# Altium footprint library connectors_ITS.PcbLib: 30 footprints (part 2 of 2)
Each footprint in its own frame and in the unit in brackets; x right, y up, seen from the top. Pads: shape width x height; smd on the part's side, far side on the other; paste and mask are expansions set on the pad; w line width, h text height; cw(c..) or ccw(c..) is an arc to the next point about the centre after c.
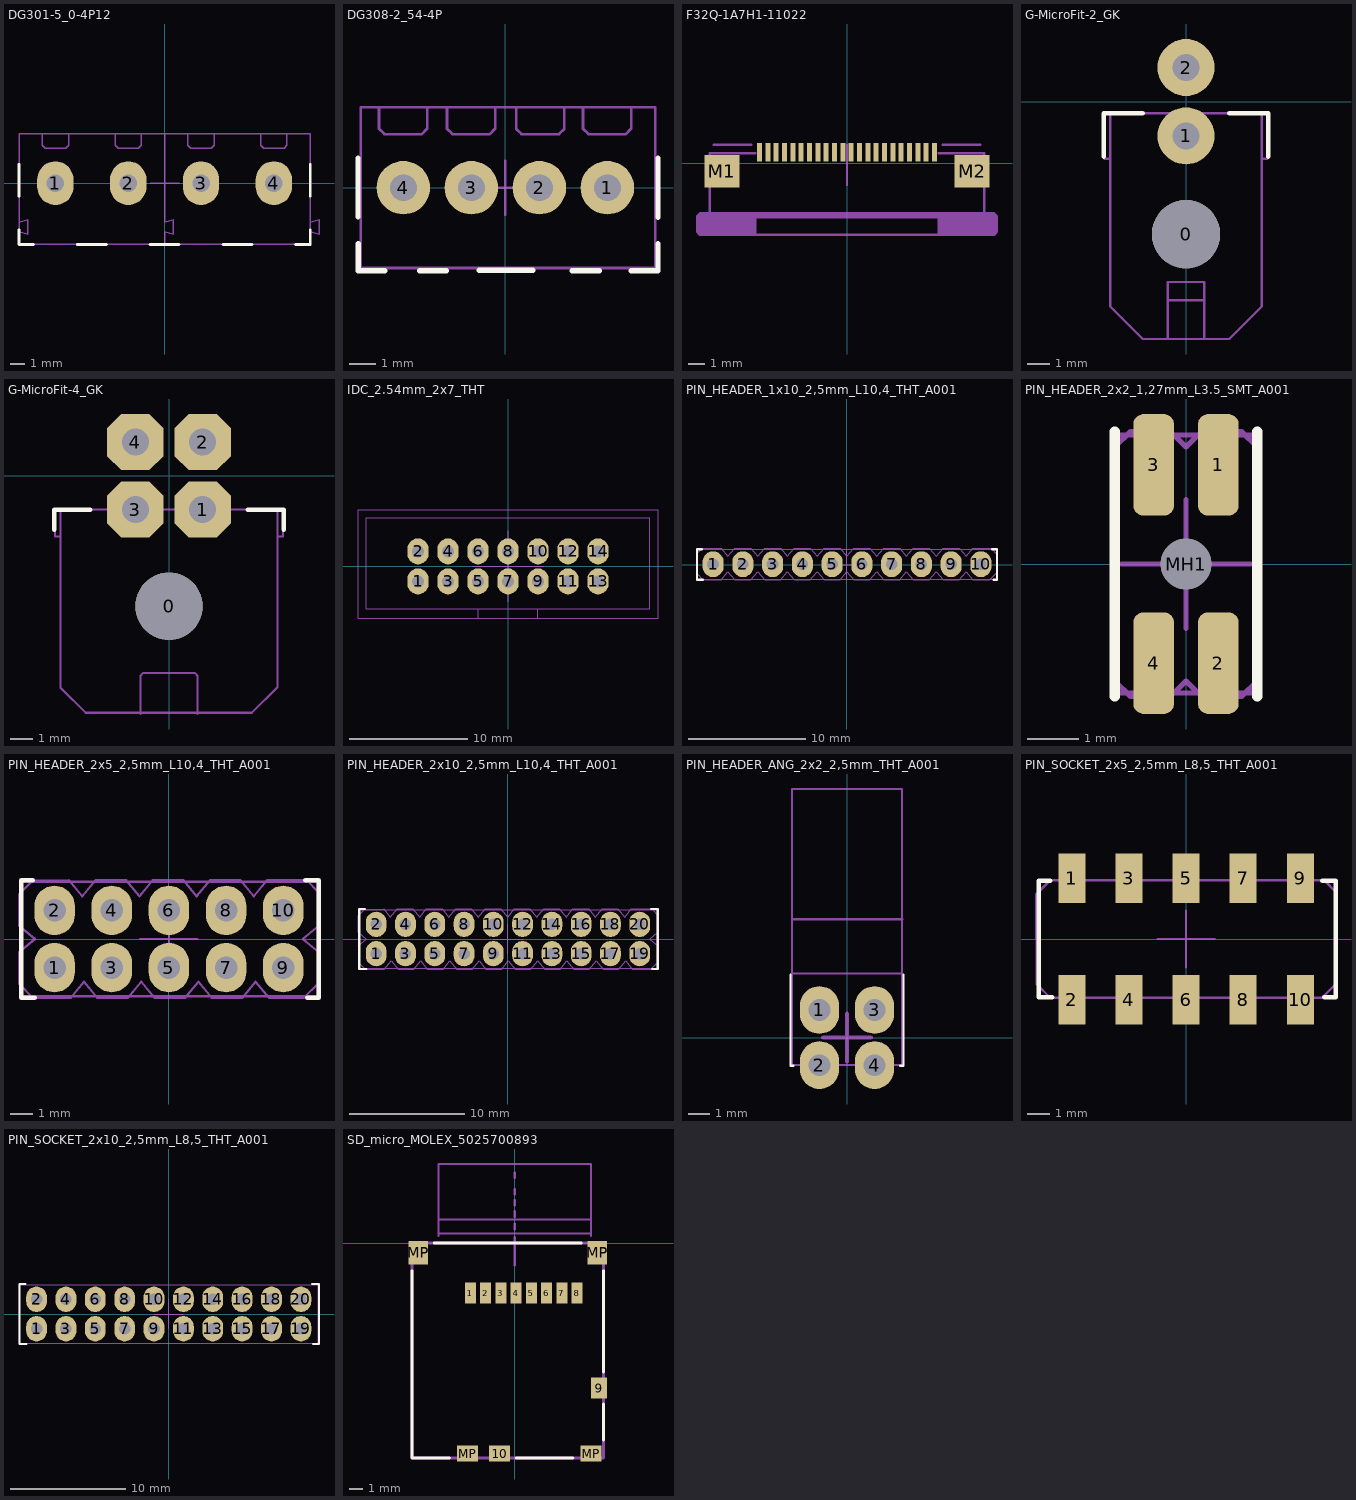
[diagram p1: the footprints below, top view; thin cyan lines are the x and y axes]

## DG301-5_0-4P12 [mm]
pads (4):
  oval 2.5x3 hole 1.2 paste-1: 1(-7.5,0) 2(-2.5,0) 3(2.5,0) 4(7.5,0)
Top Overlay:
  lines w0.2: -10,-3.2 -10,-4.2 -9,-4.2 ; -10,-0.9 -10,1.3 ; -6,-4.2 -5,-4.2 -4,-4.2 ; -1,-4.2 0,-4.2 1,-4.2 ; 4,-4.2 5,-4.2 6,-4.2 ; 9,-4.2 10,-4.2 10,-3.2 ; 10,-0.9 10,1.3
Top M15-16_orgin:
  lines w0.1: -1,0 0,0 ; 0,-1 0,0 ; 0,1 0,0 ; 1,0 0,0 ; -10,-4.2 -10,3.4 10,3.4 10,-4.2 -10,-4.2
Top M17-18_TDES:
  text "'.Designator'" at -6.798,-3 h1.2
Top M19-20_TMOT (Mech19):
  lines w0.1: -8.4,3.4 -8.4,2.6 -8.2,2.4 -6.8,2.4 -6.6,2.6 -6.6,3.4 ; -3.4,3.4 -3.4,2.6 -3.2,2.4 -1.8,2.4 -1.6,2.6 -1.6,3.4 ; 1.6,3.4 1.6,2.6 1.8,2.4 3.2,2.4 3.4,2.6 3.4,3.4 ; 6.6,3.4 6.6,2.6 6.8,2.4 8.2,2.4 8.4,2.6 8.4,3.4 ; 0,-4.2 -10,-4.2 -10,-3.325 -9.4,-3.5 -9.4,-2.5 -10,-2.675 -10,3.4 0,3.4 ; 0,-4.2 0,-3.325 0.6,-3.5 0.6,-2.5 0,-2.675 0,3.4 ; 0,-4.2 10,-4.2 10,-3.325 10.6,-3.5 10.6,-2.5 10,-2.675 10,3.4 0,3.4
3D body "DG301-5_0-2P12.STEP": height 10, standoff -4.16, extent 0,-4.2 10.6,3.4
3D body "DG301-5_0-2P12.STEP": height 10, standoff -4.16, extent -10,-4.2 0.6,3.4

## DG308-2_54-4P [mm]
pads (4):
  round 2 hole 1 paste-1: 1(3.81,0) 2(1.27,0) 3(-1.27,0) 4(-3.81,0)
Top Overlay:
  lines w0.2: -5.504,-1.091 -5.504,1.109 ; -5.5,-2.1 -5.5,-3.1 -4.5,-3.1 ; -3.2,-3.1 -2.2,-3.1 ; -0.982,-3.08 0.018,-3.08 ; 0.018,-3.08 1.018,-3.08 ; 2.5,-3.1 3.5,-3.1 ; 4.7,-3.1 5.7,-3.1 5.7,-2.1 ; 5.7,-1.1 5.7,1.1
Top M15-16_orgin:
  lines w0.1: -1,0 0,0 ; 0,-1 0,0 ; 0,1 0,0 ; 1,0 0,0 ; -5.4,-3 5.6,-3 5.6,3 -5.4,3 -5.4,-3
Top M17-18_TDES:
  text "'.Designator'" at -6.798,-2.7 h1.2
Top M19-20_TMOT (Mech19):
  lines w0.1: -4.72,3 -4.72,2.2 -4.52,2 -3.12,2 -2.92,2.2 -2.92,3 ; -2.18,3 -2.18,2.2 -1.98,2 -0.58,2 -0.38,2.2 -0.38,3 ; 2.2,3 2.2,2.2 2,2 0.6,2 0.4,2.2 0.4,3 ; 2.9,3 2.9,2.2 3.1,2 4.5,2 4.7,2.2 4.7,3 ; 0.4,3 5.6,3 5.6,-3 -5.4,-3 -5.4,3 0.4,3
3D body "DG308-4.step": height 7.84, standoff -3.99, extent -5.43,-3.022 5.57,3

## F32Q-1A7H1-11022 [mm] "FPC top 22pin e - 0,5mm"
pads (24):
  rect 0.3x1.1 smd: 1(-5.25,0.65) 2(-4.75,0.65) 3(-4.25,0.65) 4(-3.75,0.65) 5(-3.25,0.65) 6(-2.75,0.65) 7(-2.25,0.65) 8(-1.75,0.65) 9(-1.25,0.65) 10(-0.75,0.65) 11(-0.25,0.65) 12(0.25,0.65) 13(0.75,0.65) 14(1.25,0.65) 15(1.75,0.65) 16(2.25,0.65) 17(2.75,0.65) 18(3.25,0.65) 19(3.75,0.65) 20(4.25,0.65) 21(4.75,0.65) 22(5.25,0.65)
  rect 2.1x1.95 smd: M1(-7.5,-0.475) M2(7.5,-0.475)
Top M11-12_SMOT:
  rectangle: 5.132,0.258 5.355,1.075
  rectangle: 4.632,0.258 4.855,1.075
  rectangle: 4.132,0.258 4.355,1.075
  rectangle: 3.632,0.258 3.855,1.075
  rectangle: 3.132,0.258 3.355,1.075
  rectangle: 2.632,0.258 2.855,1.075
  rectangle: 2.132,0.258 2.355,1.075
  rectangle: 1.632,0.258 1.855,1.075
  rectangle: 1.132,0.258 1.355,1.075
  rectangle: 0.632,0.258 0.855,1.075
  rectangle: 0.132,0.258 0.355,1.075
  rectangle: -0.368,0.258 -0.145,1.075
  rectangle: -0.868,0.258 -0.645,1.075
  rectangle: -1.368,0.258 -1.145,1.075
  rectangle: -1.868,0.258 -1.645,1.075
  rectangle: -2.368,0.258 -2.145,1.075
  rectangle: -2.868,0.258 -2.645,1.075
  rectangle: -3.368,0.258 -3.145,1.075
  rectangle: -3.868,0.258 -3.645,1.075
  rectangle: -4.368,0.258 -4.145,1.075
  rectangle: -4.868,0.258 -4.645,1.075
  rectangle: -5.368,0.258 -5.145,1.075
  region: -5.5,-3.3 5.5,-3.3 5.5,-3 -5.5,-3
  region: 5.5,-3 8.8,-3 9,-3.2 9,-4.116 8.816,-4.3 5.5,-4.3
  region: -5.5,-3 -8.8,-3 -9,-3.2 -9,-4.116 -8.816,-4.3 -5.5,-4.3
  lines w0.15: -5.5,-3 -5.5,-4.3 ; -5.5,0.6 -8.25,0.6 -8.25,-3 ; 5.5,-3 5.5,-4.3 ; 5.5,0.6 8.25,0.6 8.25,-3 ; -8.25,-3 -8.8,-3 -9,-3.2 -9,-4.116 -8.816,-4.3 -5.5,-4.3 ; -8.25,-3 0,-3 8.25,-3 ; -5.5,-4.3 5.5,-4.3 ; 5.5,-4.3 8.816,-4.3 9,-4.116 9,-3.2 8.8,-3 8.25,-3
Top M13-14_SDES:
  text "'.Designator'" at -5.665,2.083 h1
Top M15-16_orgin:
  lines w0.15: -8,1.1 -5.75,1.1 ; 0,-1.3 0,1.1 ; 5.75,1.1 8,1.1
3D body "f32q_22pin_asm_color.STEP": height 2.01, standoff -0.04, extent -9.15,-4.4 9.15,1.1

## G-MicroFit-2_GK [mm] "Gniazdo kontowe MicroiFit 2 piny"
pads (3):
  round 3 hole 3: 0(0,-5.8)
  round 2.5 hole 1.2: 1(0,-1.5) 2(0,1.5)
Top Overlay:
  lines w0.2: -3.6,-2.4 -3.6,-0.5 -1.9,-0.5 ; 1.9,-0.5 3.6,-0.5 3.6,-2.4
Top M15-16_orgin:
  lines w0.1: -3.353,-2.5 -3.556,-2.5 -3.556,-0.5 -2.3,-0.5 ; -3.325,-0.6 -3.325,-8.975 -1.9,-10.4 1.9,-10.4 3.325,-8.975 3.325,-0.6 ; -0.8,-10.4 -0.8,-7.9 0.8,-7.9 0.8,-10.4 ; -0.8,-8.7 0.8,-8.7 ; 2.3,-0.5 3.556,-0.5 3.556,-2.5 3.327,-2.5
Top M17-18_TDES:
  text "'.Designator'" at -5.765,-3.717 h1
Top M19-20_TMOT (Mech19):
  lines w0.1: -3.353,-2.5 -3.556,-2.5 -3.556,-0.5 3.556,-0.5 3.556,-2.5 3.327,-2.5 ; -3.325,-0.5 -3.325,-8.975 -1.9,-10.4 1.9,-10.4 3.325,-8.975 3.325,-0.5 ; -0.8,-10.4 -0.8,-7.9 0.8,-7.9 0.8,-10.4 ; -0.8,-8.7 0.8,-8.7
3D body "MicroFit-2x1-GK.STEP": height 8.78, standoff -3.17, extent -3.575,-10.42 3.575,1.82

## G-MicroFit-4_GK [mm] "Gniazdo kontowe MiniFit 4 piny"
pads (5):
  round 3 hole 3 unplated: 0(0,-5.8)
  oct 2.5x2.5 hole 1.2: 1(1.5,-1.5) 2(1.5,1.5) 3(-1.5,-1.5) 4(-1.5,1.5)
Top Overlay:
  lines w0.2: -5.1,-2.4 -5.1,-1.5 -3.5,-1.5 ; 3.5,-1.5 5.1,-1.5 5.1,-2.4
Top M15-16_orgin:
  lines w0.1: -4.825,-9.432 -4.825,-1.5 ; -4.825,-2.7 -5.075,-2.7 -5.075,-1.5 5.075,-1.5 5.075,-2.7 4.825,-2.7 ; -4.813,-9.432 -3.704,-10.541 3.679,-10.541 4.822,-9.398 ; -1.27,-10.592 -1.27,-8.89 -1.143,-8.763 1.143,-8.763 1.27,-8.89 1.27,-10.592 ; 4.825,-9.398 4.825,-1.5
Top M17-18_TDES:
  text "'.Designator'" at -5.665,-3.717 h1
Top M19-20_TMOT (Mech19):
  lines w0.1: -4.825,-9.432 -4.825,-1.5 ; -4.825,-2.7 -5.075,-2.7 -5.075,-1.5 5.075,-1.5 5.075,-2.7 4.825,-2.7 ; -4.813,-9.432 -3.704,-10.541 3.679,-10.541 4.822,-9.398 ; -1.27,-10.592 -1.27,-8.89 -1.143,-8.763 1.143,-8.763 1.27,-8.89 1.27,-10.592 ; 4.825,-9.398 4.825,-1.5
3D body "MicroFit_2x2-Gk.stp": height 8.78, standoff -3.17, extent -5.117,-10.462 5.033,1.778

## IDC_2.54mm_2x7_THT [mm]
pads (14):
  oval 1.8x2.2 hole 1 paste-1: 1(-7.62,-1.27) 2(-7.62,1.27) 3(-5.08,-1.27) 4(-5.08,1.27) 5(-2.54,-1.27) 6(-2.54,1.27) 7(0,-1.27) 8(0,1.27) 9(2.54,-1.27) 10(2.54,1.27) 11(5.08,-1.27) 12(5.08,1.27) 13(7.62,-1.27) 14(7.62,1.27)
Top M15-16_orgin:
  lines w0.1: -2.989,0.007 3.011,0.007 ; -2.5,-4.4 -2.5,-3.6 2.5,-3.6 2.5,-4.4 ; 0,-3 0,3 ; -12.7,-4.4 12.7,-4.4 12.7,4.8 -12.7,4.8 -12.7,-4.4
Top M17-18_TDES:
  text "'.Designator'" at -5.665,3.283 h1
Top M19-20_TMOT (Mech19):
  lines w0.1: -12.7,-4.4 -12.7,4.8 12.7,4.8 12.7,-4.4 2.5,-4.4 2.5,-3.6 12,-3.6 12,4.1 -12,4.1 -12,-3.6 -2.5,-3.6 -2.5,-4.4 -12.7,-4.4
3D body "61201421621_IDC_THT_2x7_2_54mm.stp": height 9.11, standoff -2.99, extent -12.72,-4.425 12.72,4.75

## PIN_HEADER_1x10_2,5mm_L10,4_THT_A001 [mm]
pads (10):
  oval 1.8x2.2 hole 1 paste-1: 1(-11.43,0.03) 2(-8.89,0.03) 3(-6.35,0.03) 4(-3.81,0.03) 5(-1.27,0.03) 6(1.27,0.03) 7(3.81,0.03) 8(6.35,0.03) 9(8.89,0.03) 10(11.43,0.03)
Top Overlay:
  lines w0.2: -12.4,1.308 -12.8,1.308 -12.8,-1.303 -12.3,-1.303 ; 12.4,1.315 12.8,1.315 12.8,-1.29 12.5,-1.29
Top M15-16_orgin:
  lines w0.1: -1.27,0 0,0 ; 0,-1.27 0,0 ; 0,1.27 0,0 ; 1.27,0 0,0 ; -12.8,-1.27 -12.8,1.3 12.8,1.3 12.8,-1.27 -12.8,-1.27
Top M17-18_TDES:
  text "'.Designator'" at -5.665,2.283 h1
Top M19-20_TMOT (Mech19):
  lines w0.1: -12.803,-0.797 -12.292,-1.308 -10.75,-1.308 -10.16,-0.6 -9.57,-1.308 -8.21,-1.308 -7.62,-0.6 -7.03,-1.308 -5.67,-1.308 -5.08,-0.6 -4.49,-1.308 -3.13,-1.308 -2.54,-0.6 -1.95,-1.308 -0.59,-1.308 0,-0.6 0.59,-1.308 1.95,-1.308 2.54,-0.6 3.13,-1.308 4.49,-1.308 5.08,-0.6 5.67,-1.308 7.03,-1.308 7.62,-0.6 8.21,-1.308 9.57,-1.308 10.16,-0.6 10.75,-1.308 12.192,-1.308 12.798,-0.702 12.805,0.894 12.295,1.408 10.75,1.408 10.16,0.7 9.57,1.408 8.21,1.408 7.62,0.7 7.03,1.408 5.67,1.408 5.08,0.7 4.49,1.408 3.13,1.408 2.54,0.7 1.95,1.408 0.59,1.408 0,0.7 -0.59,1.408 -1.95,1.408 -2.54,0.7 -3.13,1.408 -4.49,1.408 -5.08,0.7 -5.67,1.408 -7.03,1.408 -7.62,0.7 -8.21,1.408 -9.57,1.408 -10.16,0.7 -10.75,1.408 -12.362,1.402 -12.793,0.969 -12.803,-0.797
3D body "idc_1x10_2_54_10_4mm.STEP": height 16.41, standoff -2.99, extent -12.7,-1.27 12.7,1.33

## PIN_HEADER_2x2_1,27mm_L3.5_SMT_A001 [mm]
pads (5):
  rrect50% 0.8x2 smd: 1(0.635,1.95)
  rrect50% 0.8x2 smd paste-1: 2(0.635,-1.95) 3(-0.635,1.95) 4(-0.635,-1.95)
  round 1 hole 1 unplated: MH1(0,0)
Top Overlay:
  lines w0.2: -1.4,-2.6 -1.4,2.6 ; 1.4,-2.6 1.4,2.6
Top M13-14_SDES:
  text "'.Designator'" at -5.665,3.283 h1
Top M15-16_orgin:
  lines w0.1: -1.27,0 0,0 ; 0,-1.27 0,0 ; 0,1.27 0,0 ; 1.27,0 0,0 ; -1.4,-2.54 -1.4,2.54 1.4,2.54 1.4,-2.54 -1.4,-2.54
Top M19-20_TMOT (Mech19):
  region: 0.9,-1.3 0.4,-1.3 0.4,-2.8 0.9,-2.8
  region: -0.37,-1.3 -0.87,-1.3 -0.87,-2.8 -0.37,-2.8
  rectangle: 0.37,1.3 0.87,2.8
  rectangle: -0.9,1.3 -0.4,2.8
  lines w0.1: -1.4,-2.3 -1.4,2.3 -1.092,2.608 -0.308,2.608 0,2.3 0.308,2.608 1.092,2.608 1.4,2.3 1.4,-2.3 1.092,-2.608 0.308,-2.608 0,-2.3 -0.308,-2.608 -1.092,-2.608 -1.4,-2.3
3D body "62100421021 (rev1).stp": height 5.92, standoff 0.01, extent -1.27,-2.5 1.27,2.5

## PIN_HEADER_2x5_2,5mm_L10,4_THT_A001 [mm]
pads (10):
  oval 1.8x2.2 hole 1 paste-1: 1(-5.08,-1.27) 2(-5.08,1.27) 3(-2.54,-1.27) 4(-2.54,1.27) 5(0,-1.27) 6(0,1.27) 7(2.54,-1.27) 8(2.54,1.27) 9(5.08,-1.27) 10(5.08,1.27)
Top Overlay:
  lines w0.2: -6.05,2.6 -6.55,2.6 -6.55,-2.6 -5.95,-2.6 ; 6.05,2.6 6.65,2.6 6.65,-2.6 6.15,-2.6
Top M15-16_orgin:
  lines w0.1: -1.27,0 0,0 ; 0,-1.27 0,0 ; 0,1.27 0,0 ; 1.27,0 0,0 ; -6.6,-2.54 6.6,-2.54 6.6,2.54 -6.6,2.54 -6.6,-2.54
Top M17-18_TDES:
  text "'.Designator'" at -5.665,3.383 h1
Top M19-20_TMOT (Mech19):
  lines w0.1: -6.658,-0.59 -6.65,-2 -6.042,-2.608 -4.36,-2.608 -3.77,-1.9 -3.18,-2.608 -1.82,-2.608 -1.23,-1.9 -0.64,-2.608 0.72,-2.608 1.31,-1.9 1.9,-2.608 3.26,-2.608 3.85,-1.9 4.44,-2.608 5.992,-2.608 6.651,-1.949 6.658,-0.59 5.95,0 6.658,0.59 6.664,2.059 6.12,2.608 4.36,2.608 3.77,1.9 3.18,2.608 1.82,2.608 1.23,1.9 0.64,2.608 -0.72,2.608 -1.31,1.9 -1.9,2.608 -3.26,2.608 -3.85,1.9 -4.44,2.608 -6.052,2.602 -6.65,2 -6.658,0.59 -5.95,0 -6.658,-0.59
3D body "idc_2x5_2_54_10_4mm.STEP": height 16.41, standoff -2.99, extent -6.336,-2.596 6.364,2.544

## PIN_HEADER_2x10_2,5mm_L10,4_THT_A001 [mm]
pads (20):
  oval 1.8x2.2 hole 1 paste-1: 1(-11.43,-1.27) 2(-11.43,1.27) 3(-8.89,-1.27) 4(-8.89,1.27) 5(-6.35,-1.27) 6(-6.35,1.27) 7(-3.81,-1.27) 8(-3.81,1.27) 9(-1.27,-1.27) 10(-1.27,1.27) 11(1.27,-1.27) 12(1.27,1.27) 13(3.81,-1.27) 14(3.81,1.27) 15(6.35,-1.27) 16(6.35,1.27) 17(8.89,-1.27) 18(8.89,1.27) 19(11.43,-1.27) 20(11.43,1.27)
Top Overlay:
  lines w0.2: -12.4,2.6 -12.9,2.6 -12.9,-2.6 -12.3,-2.6 ; 12.4,2.6 13,2.6 13,-2.6 12.5,-2.6
Top M15-16_orgin:
  lines w0.1: -1.27,0 0,0 ; 0,-1.27 0,0 ; 0,1.27 0,0 ; 1.27,0 0,0 ; -12.95,-2.54 12.95,-2.54 12.95,2.54 -12.95,2.54 -12.95,-2.54
Top M17-18_TDES:
  text "'.Designator'" at -5.665,3.283 h1
Top M19-20_TMOT (Mech19):
  lines w0.1: 12.5,2.6 13.015,2.081 13.008,0.59 12.3,0 13.008,-0.59 13.001,-1.999 12.392,-2.608 10.79,-2.608 10.2,-1.9 9.61,-2.608 8.25,-2.608 7.66,-1.9 7.07,-2.608 5.71,-2.608 5.12,-1.9 4.53,-2.608 3.17,-2.608 2.58,-1.9 1.99,-2.608 0.63,-2.608 0.04,-1.9 -0.55,-2.608 -1.91,-2.608 -2.5,-1.9 -3.09,-2.608 -4.45,-2.608 -5.04,-1.9 -5.63,-2.608 -6.99,-2.608 -7.58,-1.9 -8.17,-2.608 -9.53,-2.608 -10.12,-1.9 -10.71,-2.608 -12.392,-2.608 -13,-2 -13.008,-0.59 -12.3,0 -13.008,0.59 -13,2 -12.402,2.602 -10.79,2.608 -10.2,1.9 -9.61,2.608 -8.25,2.608 -7.66,1.9 -7.07,2.608 -5.71,2.608 -5.12,1.9 -4.53,2.608 -3.17,2.608 -2.58,1.9 -1.99,2.608 -0.63,2.608 -0.04,1.9 0.55,2.608 1.91,2.608 2.5,1.9 3.09,2.608 4.45,2.608 5.04,1.9 5.63,2.608 6.99,2.608 7.58,1.9 8.17,2.608 9.53,2.608 10.12,1.9 10.71,2.608 12.5,2.608
3D body "idc_2x10_2_54_10_4mm.STEP": height 16.41, standoff -2.99, extent -12.686,-2.556 12.714,2.584

## PIN_HEADER_ANG_2x2_2,5mm_THT_A001 [mm]
pads (4):
  oval 1.8x2.2 hole 1 paste-1: 1(-1.27,1.27) 2(-1.27,-1.27) 3(1.27,1.27) 4(1.27,-1.27)
Top Overlay:
  lines w0.1: -2.6,2.9 -2.6,-1.3 -2.467,-1.3 ; 2.446,-1.298 2.446,-1.3 2.6,-1.3 2.6,2.9
Top M15-16_orgin:
  lines w0.2: -1.1,0 0,0 ; 0,-1.1 0,0 ; 0,1.1 0,0 ; 1.1,0 0,0
Top M17-18_TDES:
  text "'.Designator'" at -5.665,2.983 h1
Top M19-20_TMOT (Mech19):
  lines w0.1: -2.551,2.95 2.537,2.95 ; -2.533,5.45 2.555,5.45 ; -2.54,-1.27 2.54,-1.27 2.54,11.45 -2.54,11.45 -2.54,-1.27
3D body "61300421021_2x2_2_54.stp": height 5.09, standoff -2.99, extent -2.545,-1.59 2.535,11.31

## PIN_SOCKET_2x5_2,5mm_L8,5_THT_A001 [mm]
pads (10):
  rect 1.2x2.2 smd paste-1: 1(-5.08,2.7) 2(-5.08,-2.7) 3(-2.54,2.7) 4(-2.54,-2.7) 5(0,2.7) 6(0,-2.7) 7(2.54,2.7) 8(2.54,-2.7) 9(5.08,2.7) 10(5.08,-2.7)
Top Overlay:
  lines w0.2: -6.05,2.6 -6.55,2.6 -6.55,-2.6 -5.95,-2.6 ; 6.05,2.6 6.65,2.6 6.65,-2.6 6.15,-2.6
Top M11-12_SMOT:
  lines w0.1: -6.673,2 -6.65,-2 -6.042,-2.608 6.042,-2.608 6.651,-1.999 6.658,-0.59 ; -6.65,2 -6.052,2.602 ; -6.052,2.608 6.15,2.608 ; 6.15,2.6 6.665,2.081 6.653,-0.59
Top M13-14_SDES:
  text "'.Designator'" at -5.665,-0.417 h1
Top M15-16_orgin:
  lines w0.1: -1.27,0 0,0 ; 0,-1.27 0,0 ; 0,1.27 0,0 ; 1.27,0 0,0
3D body "61001021821_socket_2_54_2x5_SMT.stp": height 7.46, standoff 0.01, extent -6.6,-3.35 6.6,3.35

## PIN_SOCKET_2x10_2,5mm_L8,5_THT_A001 [mm]
pads (20):
  oval 1.8x2.2 hole 1 paste-1: 1(-11.43,-1.27) 2(-11.43,1.27) 3(-8.89,-1.27) 4(-8.89,1.27) 5(-6.35,-1.27) 6(-6.35,1.27) 7(-3.81,-1.27) 8(-3.81,1.27) 9(-1.27,-1.27) 10(-1.27,1.27) 11(1.27,-1.27) 12(1.27,1.27) 13(3.81,-1.27) 14(3.81,1.27) 15(6.35,-1.27) 16(6.35,1.27) 17(8.89,-1.27) 18(8.89,1.27) 19(11.43,-1.27) 20(11.43,1.27)
Top Overlay:
  lines w0.2: -12.4,2.6 -12.9,2.6 -12.9,-2.6 -12.3,-2.6 ; 12.4,2.6 13,2.6 13,-2.6 12.5,-2.6
Top M15-16_orgin:
  lines w0.1: -1.27,0 0,0 ; 0,-1.27 0,0 ; 0,1.27 0,0 ; 1.27,0 0,0
Top M17-18_TDES:
  text "'.Designator'" at -6.265,3.283 h1
Top M19-20_TMOT (Mech19):
  lines w0.1: -12.95,-2.54 12.95,-2.54 12.95,2.54 -12.95,2.54 -12.95,-2.54
3D body "61302021821_PinHeaderSocket_2x10_2_54_v1.stp": height 8.41, standoff -3.14, extent -12.95,-2.54 12.95,2.54

## SD_micro_MOLEX_5025700893 [mm] "MOLEX : 502570-0893"
pads (14):
  rect 0.8x1.5 smd: 1(-3.2,-3.6) 2(-2.1,-3.6) 3(-1,-3.6) 4(0.1,-3.6) 5(1.2,-3.6) 6(2.3,-3.6) 7(3.4,-3.6) 8(4.5,-3.6)
  rect 1.15x1.5 smd: 9(6.075,-10.45)
  rect 1.5x1.15 smd: 10(-1.1,-15.175) MP(-3.4,-15.175) MP(5.5,-15.175)
  rect 1.4x1.7 smd: MP(-6.95,-0.7) MP(5.95,-0.7)
Top Overlay:
  lines w0.2: -7.4,-2 -7.4,-15.5 -4.7,-15.5 ; -5.8,0 4.8,0 ; 0.1,-15.5 4.2,-15.5 ; 6.4,-14.2 6.4,-11.6 ; 6.4,-9.3 6.4,-2
Top M11-12_SMOT:
  rectangle: -7.6,-1.4 -6.3,-0.1
  rectangle: 5.4,-1.4 6.6,-0.1
  rectangle: 5.6,-11.1 6.6,-9.8
  rectangle: 5,-15.7 6.2,-14.8
  rectangle: -4,-15.7 -2.8,-14.8
  rectangle: -1.7,-15.7 -0.5,-14.8
  lines w0.152: -5.5,0.5 -5.5,5.7 5.5,5.7 5.5,0.5 ; -5.5,0.7 5.5,0.7 ; -5.5,1.7 5.5,1.7 ; 0,1 0,1.4 ; 0,1.9 0,2.3 ; 0,2.7 0,3.1 ; 0,3.5 0,3.9 ; 0,4.7 0,5.1
  lines w0.2: -7.4,-15.5 -7.4,0 6.4,0 6.4,-15.5 -7.4,-15.5
Top M13-14_SDES:
  text "'.Designator'" at -6.165,-7.917 h1
Top M15-16_orgin:
  lines w0.2: -1.6,0 0,0 ; 0,-1.6 0,0 ; 0,0.4 0,0 ; 1.6,0 0,0
Bottom M15-16_orgin:
  lines w0.2: -7.4,-2 -7.4,-15.5 -4.7,-15.5 ; -5.8,0 4.8,0 ; 0.1,-15.5 4.2,-15.5 ; 6.4,-14.2 6.4,-11.6 ; 6.4,-9.3 6.4,-2
3D body "SM_Micro_5025700893.STEP": height 1.8, standoff 0, extent -7.4,-15.5 6.4,0